# Altium integrated library Altium_WCAP-ATET (rev19a).IntLib: 72 symbols (continued)
## 860130673002
designator C?, comment 22uF, 50V
WCAP-ATET THT Aluminum Electrolytic Capacitors, D6.3mm x L11mm, 22uF, +/-20%, 50VDC; Part Number: 860130673002; Dissipation Factor: 10%; Endurance: 1000h; Leakage Current: 11uA; Ripple Current max.: 75mA; Technical Reference: ATGD110220M050DSPA4A000; ComponentLink1Description: Manufacturer; ComponentLink1URL: http://www.we-online.de; ComponentLink2Description: Datasheet; ComponentLink2URL: https://katalog.we-online.com/pbs/datasheet/860130673002.pdf; Length: 11mm; Mounting Technology: THT; Operating Temperature: -40 to +125degC; Packaging: Ammo Pack; Published Date: August 2019; Capacitance: 22uF; Diameter: 6.3mm; Publisher: Wurth Elektronik; Capacitance Tolerance: +/-20%; Rated Voltage: 50VDC
footprint WCAP-ATET_6.3x11
pins: 1 N, 2 P

## 860130674003
designator C?, comment 33uF, 50V
WCAP-ATET THT Aluminum Electrolytic Capacitors, D8mm x L11.5mm, 33uF, +/-20%, 50VDC; Part Number: 860130674003; Dissipation Factor: 10%; Endurance: 2000h; Leakage Current: 16.5uA; Ripple Current max.: 122mA; Technical Reference: ATGE115330M050DSPA7B000; ComponentLink1Description: Manufacturer; ComponentLink1URL: http://www.we-online.de; ComponentLink2Description: Datasheet; ComponentLink2URL: https://katalog.we-online.com/pbs/datasheet/860130674003.pdf; Length: 11.5mm; Mounting Technology: THT; Operating Temperature: -40 to +125degC; Packaging: Ammo Pack; Published Date: August 2019; Capacitance: 33uF; Diameter: 8mm; Publisher: Wurth Elektronik; Capacitance Tolerance: +/-20%; Rated Voltage: 50VDC
footprint WCAP-ATET_8x11.5
pins: 1 N, 2 P

## 860130674004
designator C?, comment 47uF, 50V
WCAP-ATET THT Aluminum Electrolytic Capacitors, D8mm x L11.5mm, 47uF, +/-20%, 50VDC; Part Number: 860130674004; Dissipation Factor: 10%; Endurance: 2000h; Leakage Current: 23.5uA; Ripple Current max.: 140mA; Technical Reference: ATGE115470M050DSPA7B000; ComponentLink1Description: Manufacturer; ComponentLink1URL: http://www.we-online.de; ComponentLink2Description: Datasheet; ComponentLink2URL: https://katalog.we-online.com/pbs/datasheet/860130674004.pdf; Length: 11.5mm; Mounting Technology: THT; Operating Temperature: -40 to +125degC; Packaging: Ammo Pack; Published Date: August 2019; Capacitance: 47uF; Diameter: 8mm; Publisher: Wurth Elektronik; Capacitance Tolerance: +/-20%; Rated Voltage: 50VDC
footprint WCAP-ATET_8x11.5
pins: 1 N, 2 P

## 860130675005
designator C?, comment 47uF, 50V
WCAP-ATET THT Aluminum Electrolytic Capacitors, D10mm x L12.5mm, 47uF, +/-20%, 50VDC; Part Number: 860130675005; Dissipation Factor: 10%; Endurance: 2000h; Leakage Current: 23.5uA; Ripple Current max.: 164mA; Technical Reference: ATGF125470M050DSPA9B000; ComponentLink1Description: Manufacturer; ComponentLink1URL: http://www.we-online.de; ComponentLink2Description: Datasheet; ComponentLink2URL: https://katalog.we-online.com/pbs/datasheet/860130675005.pdf; Length: 12.5mm; Mounting Technology: THT; Operating Temperature: -40 to +125degC; Packaging: Ammo Pack; Published Date: August 2019; Capacitance: 47uF; Diameter: 10mm; Publisher: Wurth Elektronik; Capacitance Tolerance: +/-20%; Rated Voltage: 50VDC
footprint WCAP-ATET_10x12.5
pins: 1 N, 2 P

## 860130675006
designator C?, comment 100uF, 50V
WCAP-ATET THT Aluminum Electrolytic Capacitors, D10mm x L16mm, 100uF, +/-20%, 50VDC; Part Number: 860130675006; Dissipation Factor: 10%; Endurance: 2000h; Leakage Current: 50uA; Ripple Current max.: 250mA; Technical Reference: ATGF160101M050DSPAAB000; ComponentLink1Description: Manufacturer; ComponentLink1URL: http://www.we-online.de; ComponentLink2Description: Datasheet; ComponentLink2URL: https://katalog.we-online.com/pbs/datasheet/860130675006.pdf; Length: 16mm; Mounting Technology: THT; Operating Temperature: -40 to +125degC; Packaging: Ammo Pack; Published Date: August 2019; Capacitance: 100uF; Diameter: 10mm; Publisher: Wurth Elektronik; Capacitance Tolerance: +/-20%; Rated Voltage: 50VDC
footprint WCAP-ATET_10x16
pins: 1 N, 2 P

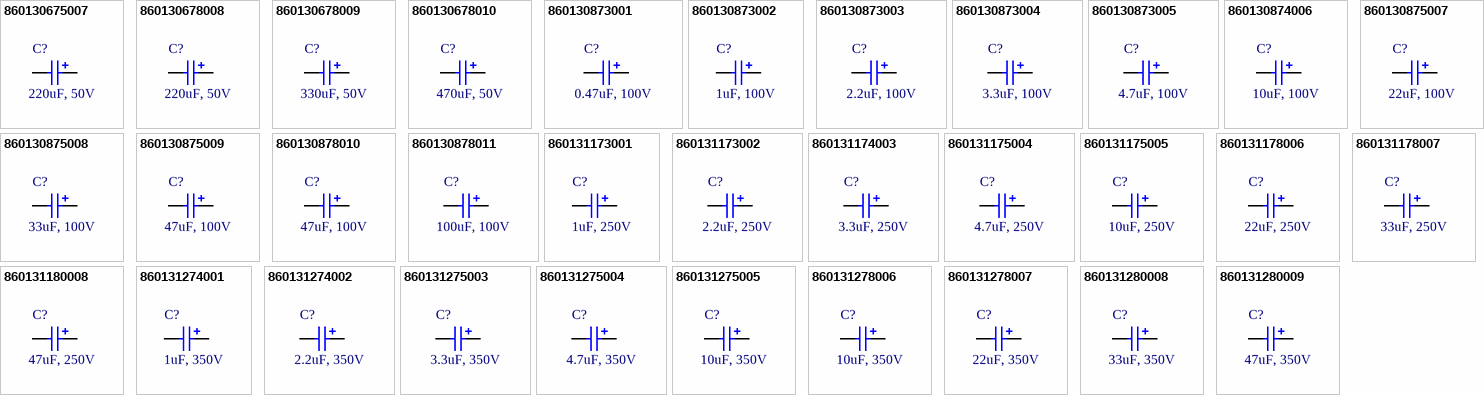
[diagram p1: symbols 860130675007 to 860131280009]

## 860130675007
designator C?, comment 220uF, 50V
WCAP-ATET THT Aluminum Electrolytic Capacitors, D10mm x L25mm, 220uF, +/-20%, 50VDC; Part Number: 860130675007; Dissipation Factor: 10%; Endurance: 2000h; Leakage Current: 110uA; Ripple Current max.: 560mA; Technical Reference: ATGF250221M050DSPAAB000; ComponentLink1Description: Manufacturer; ComponentLink1URL: http://www.we-online.de; ComponentLink2Description: Datasheet; ComponentLink2URL: https://katalog.we-online.com/pbs/datasheet/860130675007.pdf; Length: 25mm; Mounting Technology: THT; Operating Temperature: -40 to +125degC; Packaging: Ammo Pack; Published Date: August 2019; Capacitance: 220uF; Diameter: 10mm; Publisher: Wurth Elektronik; Capacitance Tolerance: +/-20%; Rated Voltage: 50VDC
footprint WCAP-ATET_10x25
pins: 1 N, 2 P

## 860130678008
designator C?, comment 220uF, 50V
WCAP-ATET THT Aluminum Electrolytic Capacitors, D13mm x L20mm, 220uF, +/-20%, 50VDC; Part Number: 860130678008; Dissipation Factor: 10%; Endurance: 3000h; Leakage Current: 110uA; Ripple Current max.: 587mA; Technical Reference: ATGI200221M050DSPACC000; ComponentLink1Description: Manufacturer; ComponentLink1URL: http://www.we-online.de; ComponentLink2Description: Datasheet; ComponentLink2URL: https://katalog.we-online.com/pbs/datasheet/860130678008.pdf; Length: 20mm; Mounting Technology: THT; Operating Temperature: -40 to +125degC; Packaging: Ammo Pack; Published Date: August 2019; Capacitance: 220uF; Diameter: 13mm; Publisher: Wurth Elektronik; Capacitance Tolerance: +/-20%; Rated Voltage: 50VDC
footprint WCAP-ATET_13x20
pins: 1 N, 2 P

## 860130678009
designator C?, comment 330uF, 50V
WCAP-ATET THT Aluminum Electrolytic Capacitors, D13mm x L20mm, 330uF, +/-20%, 50VDC; Part Number: 860130678009; Dissipation Factor: 10%; Endurance: 3000h; Leakage Current: 165uA; Ripple Current max.: 810mA; Technical Reference: ATGI200331M050DSPACC000; ComponentLink1Description: Manufacturer; ComponentLink1URL: http://www.we-online.de; ComponentLink2Description: Datasheet; ComponentLink2URL: https://katalog.we-online.com/pbs/datasheet/860130678009.pdf; Length: 20mm; Mounting Technology: THT; Operating Temperature: -40 to +125degC; Packaging: Ammo Pack; Published Date: August 2019; Capacitance: 330uF; Diameter: 13mm; Publisher: Wurth Elektronik; Capacitance Tolerance: +/-20%; Rated Voltage: 50VDC
footprint WCAP-ATET_13x20
pins: 1 N, 2 P

## 860130678010
designator C?, comment 470uF, 50V
WCAP-ATET THT Aluminum Electrolytic Capacitors, D13mm x L25mm, 470uF, +/-20%, 50VDC; Part Number: 860130678010; Dissipation Factor: 10%; Endurance: 3000h; Leakage Current: 235uA; Ripple Current max.: 900mA; Technical Reference: ATGI250471M050DSPACC000; ComponentLink1Description: Manufacturer; ComponentLink1URL: http://www.we-online.de; ComponentLink2Description: Datasheet; ComponentLink2URL: https://katalog.we-online.com/pbs/datasheet/860130678010.pdf; Length: 25mm; Mounting Technology: THT; Operating Temperature: -40 to +125degC; Packaging: Ammo Pack; Published Date: August 2019; Capacitance: 470uF; Diameter: 13mm; Publisher: Wurth Elektronik; Capacitance Tolerance: +/-20%; Rated Voltage: 50VDC
footprint WCAP-ATET_13x25
pins: 1 N, 2 P

## 860130873001
designator C?, comment 0.47uF, 100V
WCAP-ATET THT Aluminum Electrolytic Capacitors, D6.3mm x L11mm, 0.47uF, +/-20%, 100VDC; Part Number: 860130873001; Dissipation Factor: 7%; Endurance: 1000h; Leakage Current: 3uA; Ripple Current max.: 14mA; Technical Reference: ATGD110R47M100DSPA4A000; ComponentLink1Description: Manufacturer; ComponentLink1URL: http://www.we-online.de; ComponentLink2Description: Datasheet; ComponentLink2URL: https://katalog.we-online.com/pbs/datasheet/860130873001.pdf; Length: 11mm; Mounting Technology: THT; Operating Temperature: -40 to +125degC; Packaging: Ammo Pack; Published Date: August 2019; Capacitance: 0.47uF; Diameter: 6.3mm; Publisher: Wurth Elektronik; Capacitance Tolerance: +/-20%; Rated Voltage: 100VDC
footprint WCAP-ATET_6.3x11
pins: 1 N, 2 P

## 860130873002
designator C?, comment 1uF, 100V
WCAP-ATET THT Aluminum Electrolytic Capacitors, D6.3mm x L11mm, 1uF, +/-20%, 100VDC; Part Number: 860130873002; Dissipation Factor: 7%; Endurance: 1000h; Leakage Current: 3uA; Ripple Current max.: 24mA; Technical Reference: ATGD110010M100DSPA4A000; ComponentLink1Description: Manufacturer; ComponentLink1URL: http://www.we-online.de; ComponentLink2Description: Datasheet; ComponentLink2URL: https://katalog.we-online.com/pbs/datasheet/860130873002.pdf; Length: 11mm; Mounting Technology: THT; Operating Temperature: -40 to +125degC; Packaging: Ammo Pack; Published Date: August 2019; Capacitance: 1uF; Diameter: 6.3mm; Publisher: Wurth Elektronik; Capacitance Tolerance: +/-20%; Rated Voltage: 100VDC
footprint WCAP-ATET_6.3x11
pins: 1 N, 2 P

## 860130873003
designator C?, comment 2.2uF, 100V
WCAP-ATET THT Aluminum Electrolytic Capacitors, D6.3mm x L11mm, 2.2uF, +/-20%, 100VDC; Part Number: 860130873003; Dissipation Factor: 7%; Endurance: 1000h; Leakage Current: 3uA; Ripple Current max.: 31mA; Technical Reference: ATGD1102R2M100DSPA4A000; ComponentLink1Description: Manufacturer; ComponentLink1URL: http://www.we-online.de; ComponentLink2Description: Datasheet; ComponentLink2URL: https://katalog.we-online.com/pbs/datasheet/860130873003.pdf; Length: 11mm; Mounting Technology: THT; Operating Temperature: -40 to +125degC; Packaging: Ammo Pack; Published Date: August 2019; Capacitance: 2.2uF; Diameter: 6.3mm; Publisher: Wurth Elektronik; Capacitance Tolerance: +/-20%; Rated Voltage: 100VDC
footprint WCAP-ATET_6.3x11
pins: 1 N, 2 P

## 860130873004
designator C?, comment 3.3uF, 100V
WCAP-ATET THT Aluminum Electrolytic Capacitors, D6.3mm x L11mm, 3.3uF, +/-20%, 100VDC; Part Number: 860130873004; Dissipation Factor: 7%; Endurance: 1000h; Leakage Current: 3.3uA; Ripple Current max.: 36mA; Technical Reference: ATGD1103R3M100DSPA4A000; ComponentLink1Description: Manufacturer; ComponentLink1URL: http://www.we-online.de; ComponentLink2Description: Datasheet; ComponentLink2URL: https://katalog.we-online.com/pbs/datasheet/860130873004.pdf; Length: 11mm; Mounting Technology: THT; Operating Temperature: -40 to +125degC; Packaging: Ammo Pack; Published Date: August 2019; Capacitance: 3.3uF; Diameter: 6.3mm; Publisher: Wurth Elektronik; Capacitance Tolerance: +/-20%; Rated Voltage: 100VDC
footprint WCAP-ATET_6.3x11
pins: 1 N, 2 P

## 860130873005
designator C?, comment 4.7uF, 100V
WCAP-ATET THT Aluminum Electrolytic Capacitors, D6.3mm x L11mm, 4.7uF, +/-20%, 100VDC; Part Number: 860130873005; Dissipation Factor: 7%; Endurance: 1000h; Leakage Current: 4.7uA; Ripple Current max.: 38mA; Technical Reference: ATGD1104R7M100DSPA4A000; ComponentLink1Description: Manufacturer; ComponentLink1URL: http://www.we-online.de; ComponentLink2Description: Datasheet; ComponentLink2URL: https://katalog.we-online.com/pbs/datasheet/860130873005.pdf; Length: 11mm; Mounting Technology: THT; Operating Temperature: -40 to +125degC; Packaging: Ammo Pack; Published Date: August 2019; Capacitance: 4.7uF; Diameter: 6.3mm; Publisher: Wurth Elektronik; Capacitance Tolerance: +/-20%; Rated Voltage: 100VDC
footprint WCAP-ATET_6.3x11
pins: 1 N, 2 P

## 860130874006
designator C?, comment 10uF, 100V
WCAP-ATET THT Aluminum Electrolytic Capacitors, D8mm x L11.5mm, 10uF, +/-20%, 100VDC; Part Number: 860130874006; Dissipation Factor: 7%; Endurance: 2000h; Leakage Current: 10uA; Ripple Current max.: 60mA; Technical Reference: ATGE115100M100DSPA7B000; ComponentLink1Description: Manufacturer; ComponentLink1URL: http://www.we-online.de; ComponentLink2Description: Datasheet; ComponentLink2URL: https://katalog.we-online.com/pbs/datasheet/860130874006.pdf; Length: 11.5mm; Mounting Technology: THT; Operating Temperature: -40 to +125degC; Packaging: Ammo Pack; Published Date: August 2019; Capacitance: 10uF; Diameter: 8mm; Publisher: Wurth Elektronik; Capacitance Tolerance: +/-20%; Rated Voltage: 100VDC
footprint WCAP-ATET_8x11.5
pins: 1 N, 2 P

## 860130875007
designator C?, comment 22uF, 100V
WCAP-ATET THT Aluminum Electrolytic Capacitors, D10mm x L12.5mm, 22uF, +/-20%, 100VDC; Part Number: 860130875007; Dissipation Factor: 7%; Endurance: 2000h; Leakage Current: 22uA; Ripple Current max.: 90mA; Technical Reference: ATGF125220M100DSPA9B000; ComponentLink1Description: Manufacturer; ComponentLink1URL: http://www.we-online.de; ComponentLink2Description: Datasheet; ComponentLink2URL: https://katalog.we-online.com/pbs/datasheet/860130875007.pdf; Length: 12.5mm; Mounting Technology: THT; Operating Temperature: -40 to +125degC; Packaging: Ammo Pack; Published Date: August 2019; Capacitance: 22uF; Diameter: 10mm; Publisher: Wurth Elektronik; Capacitance Tolerance: +/-20%; Rated Voltage: 100VDC
footprint WCAP-ATET_10x12.5
pins: 1 N, 2 P

## 860130875008
designator C?, comment 33uF, 100V
WCAP-ATET THT Aluminum Electrolytic Capacitors, D10mm x L16mm, 33uF, +/-20%, 100VDC; Part Number: 860130875008; Dissipation Factor: 7%; Endurance: 2000h; Leakage Current: 33uA; Ripple Current max.: 140mA; Technical Reference: ATGF160330M100DSPAAB000; ComponentLink1Description: Manufacturer; ComponentLink1URL: http://www.we-online.de; ComponentLink2Description: Datasheet; ComponentLink2URL: https://katalog.we-online.com/pbs/datasheet/860130875008.pdf; Length: 16mm; Mounting Technology: THT; Operating Temperature: -40 to +125degC; Packaging: Ammo Pack; Published Date: August 2019; Capacitance: 33uF; Diameter: 10mm; Publisher: Wurth Elektronik; Capacitance Tolerance: +/-20%; Rated Voltage: 100VDC
footprint WCAP-ATET_10x16
pins: 1 N, 2 P

## 860130875009
designator C?, comment 47uF, 100V
WCAP-ATET THT Aluminum Electrolytic Capacitors, D10mm x L25mm, 47uF, +/-20%, 100VDC; Part Number: 860130875009; Dissipation Factor: 7%; Endurance: 2000h; Leakage Current: 47uA; Ripple Current max.: 175mA; Technical Reference: ATGF250470M100DSPAAB000; ComponentLink1Description: Manufacturer; ComponentLink1URL: http://www.we-online.de; ComponentLink2Description: Datasheet; ComponentLink2URL: https://katalog.we-online.com/pbs/datasheet/860130875009.pdf; Length: 25mm; Mounting Technology: THT; Operating Temperature: -40 to +125degC; Packaging: Ammo Pack; Published Date: August 2019; Capacitance: 47uF; Diameter: 10mm; Publisher: Wurth Elektronik; Capacitance Tolerance: +/-20%; Rated Voltage: 100VDC
footprint WCAP-ATET_10x25
pins: 1 N, 2 P

## 860130878010
designator C?, comment 47uF, 100V
WCAP-ATET THT Aluminum Electrolytic Capacitors, D13mm x L20mm, 47uF, +/-20%, 100VDC; Part Number: 860130878010; Dissipation Factor: 7%; Endurance: 3000h; Leakage Current: 47uA; Ripple Current max.: 185mA; Technical Reference: ATGI200470M100DSPACC000; ComponentLink1Description: Manufacturer; ComponentLink1URL: http://www.we-online.de; ComponentLink2Description: Datasheet; ComponentLink2URL: https://katalog.we-online.com/pbs/datasheet/860130878010.pdf; Length: 20mm; Mounting Technology: THT; Operating Temperature: -40 to +125degC; Packaging: Ammo Pack; Published Date: August 2019; Capacitance: 47uF; Diameter: 13mm; Publisher: Wurth Elektronik; Capacitance Tolerance: +/-20%; Rated Voltage: 100VDC
footprint WCAP-ATET_13x20
pins: 1 N, 2 P

## 860130878011
designator C?, comment 100uF, 100V
WCAP-ATET THT Aluminum Electrolytic Capacitors, D13mm x L25mm, 100uF, +/-20%, 100VDC; Part Number: 860130878011; Dissipation Factor: 7%; Endurance: 3000h; Leakage Current: 100uA; Ripple Current max.: 270mA; Technical Reference: ATGI250101M100DSPACC000; ComponentLink1Description: Manufacturer; ComponentLink1URL: http://www.we-online.de; ComponentLink2Description: Datasheet; ComponentLink2URL: https://katalog.we-online.com/pbs/datasheet/860130878011.pdf; Length: 25mm; Mounting Technology: THT; Operating Temperature: -40 to +125degC; Packaging: Ammo Pack; Published Date: August 2019; Capacitance: 100uF; Diameter: 13mm; Publisher: Wurth Elektronik; Capacitance Tolerance: +/-20%; Rated Voltage: 100VDC
footprint WCAP-ATET_13x25
pins: 1 N, 2 P

## 860131173001
designator C?, comment 1uF, 250V
WCAP-ATET THT Aluminum Electrolytic Capacitors, D6.3mm x L11mm, 1uF, +/-20%, 250VDC; Part Number: 860131173001; Dissipation Factor: 10%; Endurance: 1000h; Leakage Current: 5uA; Ripple Current max.: 41mA; Technical Reference: ATGD110010M250DSPA4A000; ComponentLink1Description: Manufacturer; ComponentLink1URL: http://www.we-online.de; ComponentLink2Description: Datasheet; ComponentLink2URL: https://katalog.we-online.com/pbs/datasheet/860131173001.pdf; Length: 11mm; Mounting Technology: THT; Operating Temperature: -40 to +125degC; Packaging: Ammo Pack; Published Date: August 2019; Capacitance: 1uF; Diameter: 6.3mm; Publisher: Wurth Elektronik; Capacitance Tolerance: +/-20%; Rated Voltage: 250VDC
footprint WCAP-ATET_6.3x11
pins: 1 N, 2 P

## 860131173002
designator C?, comment 2.2uF, 250V
WCAP-ATET THT Aluminum Electrolytic Capacitors, D6.3mm x L11mm, 2.2uF, +/-20%, 250VDC; Part Number: 860131173002; Dissipation Factor: 10%; Endurance: 1000h; Leakage Current: 11uA; Ripple Current max.: 42mA; Technical Reference: ATGD1102R2M250DSPA4A000; ComponentLink1Description: Manufacturer; ComponentLink1URL: http://www.we-online.de; ComponentLink2Description: Datasheet; ComponentLink2URL: https://katalog.we-online.com/pbs/datasheet/860131173002.pdf; Length: 11mm; Mounting Technology: THT; Operating Temperature: -40 to +125degC; Packaging: Ammo Pack; Published Date: August 2019; Capacitance: 2.2uF; Diameter: 6.3mm; Publisher: Wurth Elektronik; Capacitance Tolerance: +/-20%; Rated Voltage: 250VDC
footprint WCAP-ATET_6.3x11
pins: 1 N, 2 P

## 860131174003
designator C?, comment 3.3uF, 250V
WCAP-ATET THT Aluminum Electrolytic Capacitors, D8mm x L11.5mm, 3.3uF, +/-20%, 250VDC; Part Number: 860131174003; Dissipation Factor: 10%; Endurance: 2000h; Leakage Current: 16.5uA; Ripple Current max.: 50mA; Technical Reference: ATGE1153R3M250DSPA7B000; ComponentLink1Description: Manufacturer; ComponentLink1URL: http://www.we-online.de; ComponentLink2Description: Datasheet; ComponentLink2URL: https://katalog.we-online.com/pbs/datasheet/860131174003.pdf; Length: 11.5mm; Mounting Technology: THT; Operating Temperature: -40 to +125degC; Packaging: Ammo Pack; Published Date: August 2019; Capacitance: 3.3uF; Diameter: 8mm; Publisher: Wurth Elektronik; Capacitance Tolerance: +/-20%; Rated Voltage: 250VDC
footprint WCAP-ATET_8x11.5
pins: 1 N, 2 P

## 860131175004
designator C?, comment 4.7uF, 250V
WCAP-ATET THT Aluminum Electrolytic Capacitors, D10mm x L12.5mm, 4.7uF, +/-20%, 250VDC; Part Number: 860131175004; Dissipation Factor: 10%; Endurance: 2000h; Leakage Current: 23.5uA; Ripple Current max.: 60mA; Technical Reference: ATGF1254R7M250DSPA9B000; ComponentLink1Description: Manufacturer; ComponentLink1URL: http://www.we-online.de; ComponentLink2Description: Datasheet; ComponentLink2URL: https://katalog.we-online.com/pbs/datasheet/860131175004.pdf; Length: 12.5mm; Mounting Technology: THT; Operating Temperature: -40 to +125degC; Packaging: Ammo Pack; Published Date: August 2019; Capacitance: 4.7uF; Diameter: 10mm; Publisher: Wurth Elektronik; Capacitance Tolerance: +/-20%; Rated Voltage: 250VDC
footprint WCAP-ATET_10x12.5
pins: 1 N, 2 P

## 860131175005
designator C?, comment 10uF, 250V
WCAP-ATET THT Aluminum Electrolytic Capacitors, D10mm x L16mm, 10uF, +/-20%, 250VDC; Part Number: 860131175005; Dissipation Factor: 10%; Endurance: 2000h; Leakage Current: 50uA; Ripple Current max.: 83mA; Technical Reference: ATGF160100M250DSPAAB000; ComponentLink1Description: Manufacturer; ComponentLink1URL: http://www.we-online.de; ComponentLink2Description: Datasheet; ComponentLink2URL: https://katalog.we-online.com/pbs/datasheet/860131175005.pdf; Length: 16mm; Mounting Technology: THT; Operating Temperature: -40 to +125degC; Packaging: Ammo Pack; Published Date: August 2019; Capacitance: 10uF; Diameter: 10mm; Publisher: Wurth Elektronik; Capacitance Tolerance: +/-20%; Rated Voltage: 250VDC
footprint WCAP-ATET_10x16
pins: 1 N, 2 P

## 860131178006
designator C?, comment 22uF, 250V
WCAP-ATET THT Aluminum Electrolytic Capacitors, D13mm x L20mm, 22uF, +/-20%, 250VDC; Part Number: 860131178006; Dissipation Factor: 10%; Endurance: 3000h; Leakage Current: 110uA; Ripple Current max.: 145mA; Technical Reference: ATGI200220M250DSPACC000; ComponentLink1Description: Manufacturer; ComponentLink1URL: http://www.we-online.de; ComponentLink2Description: Datasheet; ComponentLink2URL: https://katalog.we-online.com/pbs/datasheet/860131178006.pdf; Length: 20mm; Mounting Technology: THT; Operating Temperature: -40 to +125degC; Packaging: Ammo Pack; Published Date: August 2019; Capacitance: 22uF; Diameter: 13mm; Publisher: Wurth Elektronik; Capacitance Tolerance: +/-20%; Rated Voltage: 250VDC
footprint WCAP-ATET_13x20
pins: 1 N, 2 P

## 860131178007
designator C?, comment 33uF, 250V
WCAP-ATET THT Aluminum Electrolytic Capacitors, D13mm x L25mm, 33uF, +/-20%, 250VDC; Part Number: 860131178007; Dissipation Factor: 10%; Endurance: 3000h; Leakage Current: 165uA; Ripple Current max.: 164mA; Technical Reference: ATGI250330M250DSPACC000; ComponentLink1Description: Manufacturer; ComponentLink1URL: http://www.we-online.de; ComponentLink2Description: Datasheet; ComponentLink2URL: https://katalog.we-online.com/pbs/datasheet/860131178007.pdf; Length: 25mm; Mounting Technology: THT; Operating Temperature: -40 to +125degC; Packaging: Ammo Pack; Published Date: August 2019; Capacitance: 33uF; Diameter: 13mm; Publisher: Wurth Elektronik; Capacitance Tolerance: +/-20%; Rated Voltage: 250VDC
footprint WCAP-ATET_13x25
pins: 1 N, 2 P

## 860131180008
designator C?, comment 47uF, 250V
WCAP-ATET THT Aluminum Electrolytic Capacitors, D16mm x L25mm, 47uF, +/-20%, 250VDC; Part Number: 860131180008; Dissipation Factor: 10%; Endurance: 3000h; Leakage Current: 235uA; Ripple Current max.: 205mA; Technical Reference: ATGK250470M250DSPAEC000; ComponentLink1Description: Manufacturer; ComponentLink1URL: http://www.we-online.de; ComponentLink2Description: Datasheet; ComponentLink2URL: https://katalog.we-online.com/pbs/datasheet/860131180008.pdf; Length: 25mm; Mounting Technology: THT; Operating Temperature: -40 to +125degC; Packaging: Ammo Pack; Published Date: August 2019; Capacitance: 47uF; Diameter: 16mm; Publisher: Wurth Elektronik; Capacitance Tolerance: +/-20%; Rated Voltage: 250VDC
footprint WCAP-ATET_16x25
pins: 1 N, 2 P

## 860131274001
designator C?, comment 1uF, 350V
WCAP-ATET THT Aluminum Electrolytic Capacitors, D8mm x L11.5mm, 1uF, +/-20%, 350VDC; Part Number: 860131274001; Dissipation Factor: 12%; Endurance: 2000h; Leakage Current: 7uA; Ripple Current max.: 45mA; Technical Reference: ATGE115010M350DSPA7B000; ComponentLink1Description: Manufacturer; ComponentLink1URL: http://www.we-online.de; ComponentLink2Description: Datasheet; ComponentLink2URL: https://katalog.we-online.com/pbs/datasheet/860131274001.pdf; Length: 11.5mm; Mounting Technology: THT; Operating Temperature: -40 to +125degC; Packaging: Ammo Pack; Published Date: August 2019; Capacitance: 1uF; Diameter: 8mm; Publisher: Wurth Elektronik; Capacitance Tolerance: +/-20%; Rated Voltage: 350VDC
footprint WCAP-ATET_8x11.5
pins: 1 N, 2 P

## 860131274002
designator C?, comment 2.2uF, 350V
WCAP-ATET THT Aluminum Electrolytic Capacitors, D8mm x L11.5mm, 2.2uF, +/-20%, 350VDC; Part Number: 860131274002; Dissipation Factor: 12%; Endurance: 2000h; Leakage Current: 15.4uA; Ripple Current max.: 47mA; Technical Reference: ATGE1152R2M350DSPA7B000; ComponentLink1Description: Manufacturer; ComponentLink1URL: http://www.we-online.de; ComponentLink2Description: Datasheet; ComponentLink2URL: https://katalog.we-online.com/pbs/datasheet/860131274002.pdf; Length: 11.5mm; Mounting Technology: THT; Operating Temperature: -40 to +125degC; Packaging: Ammo Pack; Published Date: August 2019; Capacitance: 2.2uF; Diameter: 8mm; Publisher: Wurth Elektronik; Capacitance Tolerance: +/-20%; Rated Voltage: 350VDC
footprint WCAP-ATET_8x11.5
pins: 1 N, 2 P

## 860131275003
designator C?, comment 3.3uF, 350V
WCAP-ATET THT Aluminum Electrolytic Capacitors, D10mm x L12.5mm, 3.3uF, +/-20%, 350VDC; Part Number: 860131275003; Dissipation Factor: 12%; Endurance: 2000h; Leakage Current: 23.1uA; Ripple Current max.: 55mA; Technical Reference: ATGF1253R3M350DSPA9B000; ComponentLink1Description: Manufacturer; ComponentLink1URL: http://www.we-online.de; ComponentLink2Description: Datasheet; ComponentLink2URL: https://katalog.we-online.com/pbs/datasheet/860131275003.pdf; Length: 12.5mm; Mounting Technology: THT; Operating Temperature: -40 to +125degC; Packaging: Ammo Pack; Published Date: August 2019; Capacitance: 3.3uF; Diameter: 10mm; Publisher: Wurth Elektronik; Capacitance Tolerance: +/-20%; Rated Voltage: 350VDC
footprint WCAP-ATET_10x12.5
pins: 1 N, 2 P

## 860131275004
designator C?, comment 4.7uF, 350V
WCAP-ATET THT Aluminum Electrolytic Capacitors, D10mm x L16mm, 4.7uF, +/-20%, 350VDC; Part Number: 860131275004; Dissipation Factor: 12%; Endurance: 2000h; Leakage Current: 32.9uA; Ripple Current max.: 68mA; Technical Reference: ATGF1604R7M350DSPAAB000; ComponentLink1Description: Manufacturer; ComponentLink1URL: http://www.we-online.de; ComponentLink2Description: Datasheet; ComponentLink2URL: https://katalog.we-online.com/pbs/datasheet/860131275004.pdf; Length: 16mm; Mounting Technology: THT; Operating Temperature: -40 to +125degC; Packaging: Ammo Pack; Published Date: August 2019; Capacitance: 4.7uF; Diameter: 10mm; Publisher: Wurth Elektronik; Capacitance Tolerance: +/-20%; Rated Voltage: 350VDC
footprint WCAP-ATET_10x16
pins: 1 N, 2 P

## 860131275005
designator C?, comment 10uF, 350V
WCAP-ATET THT Aluminum Electrolytic Capacitors, D10mm x L25mm, 10uF, +/-20%, 350VDC; Part Number: 860131275005; Dissipation Factor: 12%; Endurance: 2000h; Leakage Current: 70uA; Ripple Current max.: 105mA; Technical Reference: ATGF250100M350DSPAAB000; ComponentLink1Description: Manufacturer; ComponentLink1URL: http://www.we-online.de; ComponentLink2Description: Datasheet; ComponentLink2URL: https://katalog.we-online.com/pbs/datasheet/860131275005.pdf; Length: 25mm; Mounting Technology: THT; Operating Temperature: -40 to +125degC; Packaging: Ammo Pack; Published Date: August 2019; Capacitance: 10uF; Diameter: 10mm; Publisher: Wurth Elektronik; Capacitance Tolerance: +/-20%; Rated Voltage: 350VDC
footprint WCAP-ATET_10x25
pins: 1 N, 2 P

## 860131278006
designator C?, comment 10uF, 350V
WCAP-ATET THT Aluminum Electrolytic Capacitors, D13mm x L20mm, 10uF, +/-20%, 350VDC; Part Number: 860131278006; Dissipation Factor: 12%; Endurance: 3000h; Leakage Current: 70uA; Ripple Current max.: 110mA; Technical Reference: ATGI200100M350DSPACC000; ComponentLink1Description: Manufacturer; ComponentLink1URL: http://www.we-online.de; ComponentLink2Description: Datasheet; ComponentLink2URL: https://katalog.we-online.com/pbs/datasheet/860131278006.pdf; Length: 20mm; Mounting Technology: THT; Operating Temperature: -40 to +125degC; Packaging: Ammo Pack; Published Date: August 2019; Capacitance: 10uF; Diameter: 13mm; Publisher: Wurth Elektronik; Capacitance Tolerance: +/-20%; Rated Voltage: 350VDC
footprint WCAP-ATET_13x20
pins: 1 N, 2 P

## 860131278007
designator C?, comment 22uF, 350V
WCAP-ATET THT Aluminum Electrolytic Capacitors, D13mm x L25mm, 22uF, +/-20%, 350VDC; Part Number: 860131278007; Dissipation Factor: 12%; Endurance: 3000h; Leakage Current: 154uA; Ripple Current max.: 160mA; Technical Reference: ATGI250220M350DSPACC000; ComponentLink1Description: Manufacturer; ComponentLink1URL: http://www.we-online.de; ComponentLink2Description: Datasheet; ComponentLink2URL: https://katalog.we-online.com/pbs/datasheet/860131278007.pdf; Length: 25mm; Mounting Technology: THT; Operating Temperature: -40 to +125degC; Packaging: Ammo Pack; Published Date: August 2019; Capacitance: 22uF; Diameter: 13mm; Publisher: Wurth Elektronik; Capacitance Tolerance: +/-20%; Rated Voltage: 350VDC
footprint WCAP-ATET_13x25
pins: 1 N, 2 P

## 860131280008
designator C?, comment 33uF, 350V
WCAP-ATET THT Aluminum Electrolytic Capacitors, D16mm x L25mm, 33uF, +/-20%, 350VDC; Part Number: 860131280008; Dissipation Factor: 12%; Endurance: 3000h; Leakage Current: 231uA; Ripple Current max.: 180mA; Technical Reference: ATGK250330M350DSPAEC000; ComponentLink1Description: Manufacturer; ComponentLink1URL: http://www.we-online.de; ComponentLink2Description: Datasheet; ComponentLink2URL: https://katalog.we-online.com/pbs/datasheet/860131280008.pdf; Length: 25mm; Mounting Technology: THT; Operating Temperature: -40 to +125degC; Packaging: Ammo Pack; Published Date: August 2019; Capacitance: 33uF; Diameter: 16mm; Publisher: Wurth Elektronik; Capacitance Tolerance: +/-20%; Rated Voltage: 350VDC
footprint WCAP-ATET_16x25
pins: 1 N, 2 P

## 860131280009
designator C?, comment 47uF, 350V
WCAP-ATET THT Aluminum Electrolytic Capacitors, D16mm x L31.5mm, 47uF, +/-20%, 350VDC; Part Number: 860131280009; Dissipation Factor: 12%; Endurance: 3000h; Leakage Current: 329uA; Ripple Current max.: 230mA; Technical Reference: ATGK315470M350DSPADC000; ComponentLink1Description: Manufacturer; ComponentLink1URL: http://www.we-online.de; ComponentLink2Description: Datasheet; ComponentLink2URL: https://katalog.we-online.com/pbs/datasheet/860131280009.pdf; Length: 31.5mm; Mounting Technology: THT; Operating Temperature: -40 to +125degC; Packaging: Ammo Pack; Published Date: August 2019; Capacitance: 47uF; Diameter: 16mm; Publisher: Wurth Elektronik; Capacitance Tolerance: +/-20%; Rated Voltage: 350VDC
footprint WCAP-ATET_16x31.5
pins: 1 N, 2 P